# Altium footprint library JL_PCB.PCBLIB: 1129 footprints (part 14 of 72)
Each footprint in its own frame and in the unit in brackets; x right, y up, seen from the top. Pads: shape width x height; smd on the part's side, far side on the other; paste and mask are expansions set on the pad; w line width, h text height; cw(c..) or ccw(c..) is an arc to the next point about the centre after c.
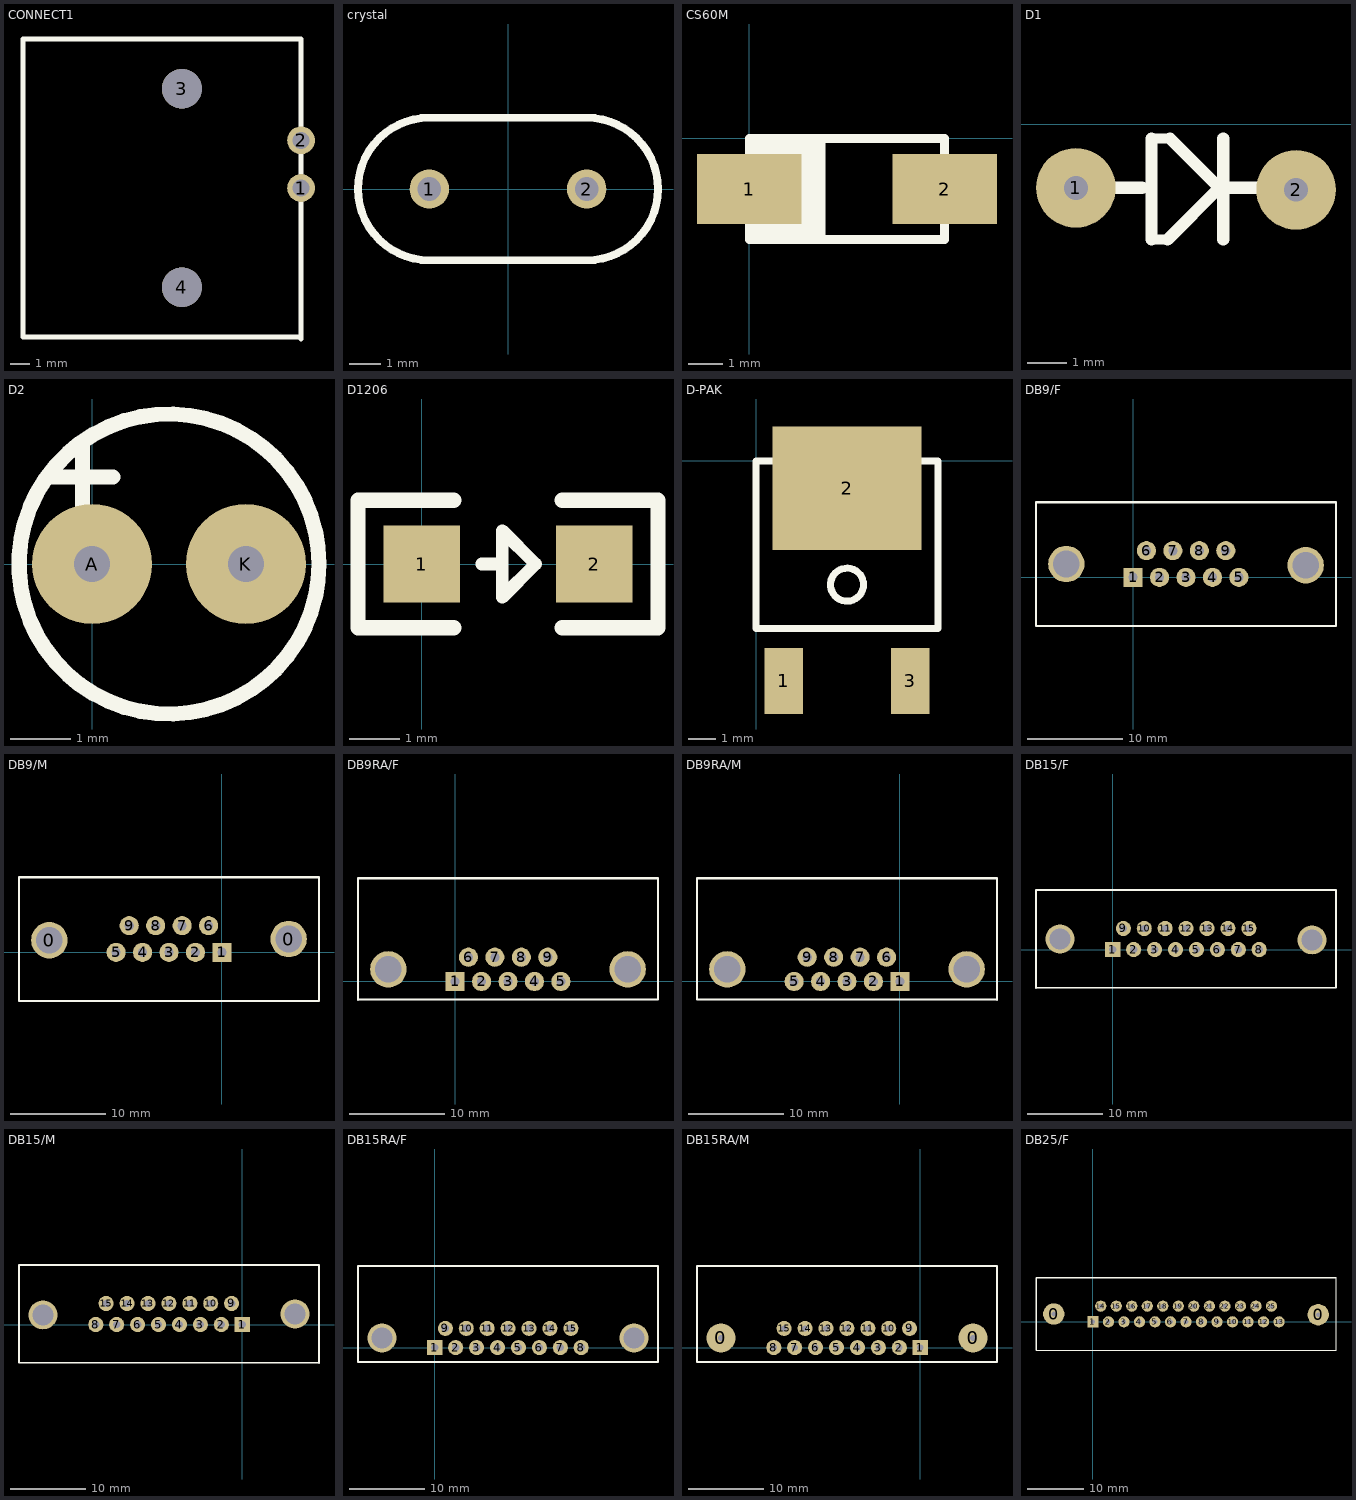
[diagram p13: the footprints below, top view; thin cyan lines are the x and y axes]

## CONNECT1 [mm]
pads (4):
  round 1.4 hole 0.85: 1(49.696,21.708) 2(49.696,24.108)
  round 2 hole 2: 3(43.696,26.708) 4(43.696,16.708)
TopOverlay:
  lines w0.254: 35.696,14.208 35.696,29.208 49.696,29.208 49.696,14.108 49.596,14.208 35.696,14.208

## crystal [mil]
pads (2):
  round 50 hole 30: 1(-100,0) 2(100,0)
TopOverlay:
  lines w10: -100,-90.55 cw(c-100,0) -100,90.55 100,90.55 cw(c100,0) 100,-90.55 -100,-90.55
3D body "CRYSTAL-HP49US.step": height 138.4, standoff -156.88, extent -224.43,-90 222.43,93.07

## CS60M [mm]
pads (2):
  rect 3x2 smd: 1(0,-1.45) 2(5.6,-1.45)
TopOverlay:
  rectangle: 0,-2.896 2.184,0
  lines w0.254: 0,-2.9 0,0 5.6,0 5.6,-2.9 0,-2.9

## D1 [mm]
pads (2):
  round 2 hole 0.6: 1(4.8,-1.6) 2(10.33,-1.65)
TopOverlay:
  lines w0.254: 6.7,-2.9 7.1,-2.9 ; 6.7,-0.36 7.16,-0.36
  lines w0.3: 6.7,-2.9 6.7,-0.36 ; 7.1,-2.9 8.4,-1.6 7.16,-0.36
  lines w0.305: 5.7,-1.6 6.462,-1.6 ; 8.5,-2.9 8.5,-0.36 ; 8.638,-1.6 9.4,-1.6

## D2 [mm]
pads (2):
  round 2 hole 0.6: A(0,0) K(2.56,0)
TopOverlay:
  circle w0.254: c1.28,0 r2.5
  lines w0.254: -0.67,1.45 0.346,1.45 ; -0.162,0.058 -0.162,1.958

## D1206 [mil]
pads (2):
  rect 60x60 smd: 1(0,0) 2(135,0)
TopOverlay:
  lines w10: 47,0 63,0 ; 63,-26 89,0 63,26 63,-26
  lines w12: 25,-50 -50,-50 -50,50 25,50 ; 110,-50 185,-50 185,50 110,50
3D body "SOD-80.step": height 59.06, standoff 0, extent -2.9,-29 134.9,30.06

## D-PAK [mm]
height 2.3
pads (3):
  rect 1.4x2.4 smd: 1(1,-8) 3(5.6,-8)
  rect 5.4x4.5 smd: 2(3.3,-1)
TopOverlay:
  circle w0.254: c3.3,-4.5 r0.6
  lines w0.254: 0,-6.1 6.6,-6.1 6.6,0 0,0 0,-6.1
3D body "D-PAK.STEP": height 2.31, standoff 0, extent 0.028,-8.385 6.628,0.865

## DB9/F [mil]
pads (11):
  rect 78.74x78.74 hole 38: 1(0,0)
  round 78.74 hole 38: 2(109,0) 3(218,0) 4(327,0) 5(436,0) 6(55,110) 7(164,110) 8(273,110) 9(382,110)
  round 150 hole 110: ""(-275,55) ""(711,50)
TopOverlay:
  lines w8: -400,-200 836,-200 836,310
  lines w10: -400,-200 -400,310 836,310
3D body "User Library-con-116-1.step": height 471.67, standoff -193.68, extent -388.21,-190.19 832.21,298

## DB9/M [mil]
pads (11):
  round 150 hole 110: 0(-711,50) 0(275,55)
  rect 78.74x78.74 hole 38: 1(0,0)
  round 78.74 hole 38: 2(-109,0) 3(-218,0) 4(-327,0) 5(-436,0) 6(-55,110) 7(-164,110) 8(-273,110) 9(-382,110)
TopOverlay:
  lines w8: -836,310 -836,-200 400,-200
  lines w10: -836,310 400,310 400,-200
3D body "User Library-Connector DB-9 Male Cable.step": height 418.71, standoff -181.29, extent -821.47,-178.52 399,306.52

## DB9RA/F [mil]
pads (11):
  rect 78.74x78.74 hole 38: 1(0,0)
  round 78.74 hole 38: 2(109,0) 3(218,0) 4(327,0) 5(436,0) 6(55,100) 7(164,100) 8(273,100) 9(382,100)
  round 150 hole 110: ""(-275,50) ""(711,50)
TopOverlay:
  lines w8: -400,-75 836,-75 836,425
  lines w10: -400,-75 -400,425 836,425
3D body "User Library-Connector DB-9-f PCB.step": height 489.57, standoff 0.6, extent -393.2,-85.64 831.2,662

## DB9RA/M [mil]
pads (11):
  rect 78.74x78.74 hole 38: 1(0,0)
  round 78.74 hole 38: 2(-109,0) 3(-218,0) 4(-327,0) 5(-436,0) 6(-55,100) 7(-164,100) 8(-273,100) 9(-382,100)
  round 150 hole 110: ""(-711,50) ""(275,50)
TopOverlay:
  lines w8: -836,425 -836,-75 400,-75
  lines w10: -836,425 400,425 400,-75
3D body "User Library-Connector DB-9-m PCB.step": height 489.57, standoff 0.6, extent -829.2,-92 395.2,667.06

## DB15/F [mil]
pads (17):
  rect 78.74x78.74 hole 38: 1(0,0)
  round 78.74 hole 38: 2(109,0) 3(218,0) 4(327,0) 5(436,0) 6(545,0) 7(654,0) 8(763,0) 9(55,110) 10(164,110) 11(273,110) 12(382,110) 13(491,110) 14(600,110) 15(709,110)
  round 150 hole 110: ""(-275,55) ""(1038,50)
TopOverlay:
  lines w8: -400,-200 1163,-200 1163,310
  lines w10: -400,-200 -400,310 1163,310
3D body "CircuitWorks-DB15_F.step": height 481.67, standoff -137.19, extent -406.1,-200.01 1168.7,311.8

## DB15/M [mil]
pads (17):
  rect 78.74x78.74 hole 38: 1(0,0)
  round 78.74 hole 38: 2(-109,0) 3(-218,0) 4(-327,0) 5(-436,0) 6(-545,0) 7(-654,0) 8(-763,0) 9(-55,110) 10(-164,110) 11(-273,110) 12(-382,110) 13(-491,110) 14(-600,110) 15(-709,110)
  round 150 hole 110: ""(-1038,50) ""(275,55)
TopOverlay:
  lines w8: -1163,310 -1163,-200 400,-200
  lines w10: -1163,310 400,310 400,-200
3D body "User Library-Connector DB-15 Male Cable.step": height 418.71, standoff -181.29, extent -1176.8,-186.04 398,299

## DB15RA/F [mil]
pads (17):
  rect 78.74x78.74 hole 38: 1(0,0)
  round 78.74 hole 38: 2(109,0) 3(218,0) 4(327,0) 5(436,0) 6(545,0) 7(654,0) 8(763,0) 9(55,100) 10(164,100) 11(273,100) 12(382,100) 13(491,100) 14(600,100) 15(709,100)
  round 150 hole 110: ""(-275,50) ""(1038,50)
TopOverlay:
  lines w8: -400,-75 1163,-75 1163,425
  lines w10: -400,-75 -400,425 1163,425
3D body "User Library-Connector DB-15-f.step": height 489.58, standoff 0.6, extent -390.98,-89 1160.98,658.64

## DB15RA/M [mil]
pads (17):
  round 150 hole 32: 0(-1038,50) 0(275,50)
  rect 78.74x78.74 hole 32: 1(0,0)
  round 78.74 hole 32: 2(-109,0) 3(-218,0) 4(-327,0) 5(-436,0) 6(-545,0) 7(-654,0) 8(-763,0) 9(-55,100) 10(-164,100) 11(-273,100) 12(-382,100) 13(-491,100) 14(-600,100) 15(-709,100)
TopOverlay:
  lines w8: -1163,425 -1163,-75 400,-75
  lines w10: -1163,425 400,425 400,-75
3D body "CircuitWorks-DB15RA_M.step": height 494.7, standoff -137.19, extent -1165.92,-78 393.92,662.16

## DB25/F [mil]
pads (27):
  round 150 hole 32: 0(-275,55) 0(1583,50)
  rect 78.74x78.74 hole 32: 1(0,0)
  round 78.74 hole 32: 2(109,0) 3(218,0) 4(327,0) 5(436,0) 6(545,0) 7(654,0) 8(763,0) 9(872,0) 10(981,0) 11(1090,0) 12(1199,0) 13(1308,0) 14(55,110) 15(164,110) 16(273,110) 17(382,110) 18(491,110) 19(600,110) 20(709,110) 21(818,110) 22(927,110) 23(1036,110) 24(1145,110) 25(1254,110)
TopOverlay:
  lines w8: -400,-200 1708,-200 1708,310
  lines w10: -400,-200 -400,310 1708,310
3D body "User Library-db-25ssp.step": height 485.72, standoff -71, extent -434.19,-197 1653,299